# Altium footprint library 13-IC Packages-2smt2e.PcbLib: 86 footprints (part 6 of 6)
Each footprint in its own frame and in the unit in brackets; x right, y up, seen from the top. Pads: shape width x height; smd on the part's side, far side on the other; paste and mask are expansions set on the pad; w line width, h text height; cw(c..) or ccw(c..) is an arc to the next point about the centre after c.
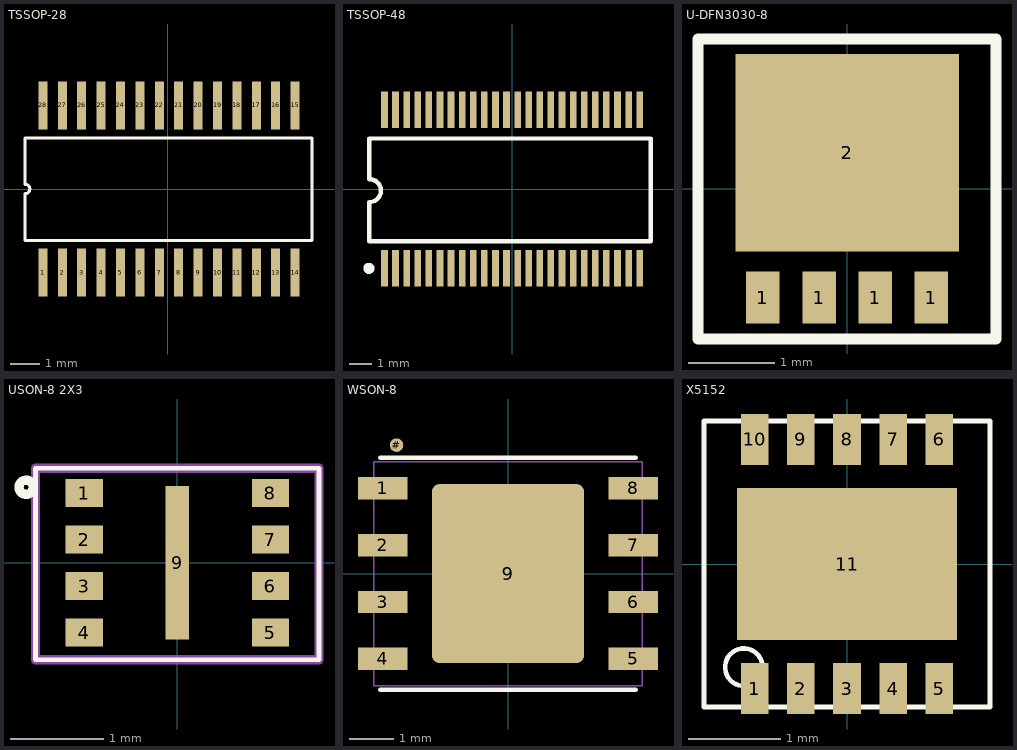
[diagram p5: the footprints below, top view; thin cyan lines are the x and y axes]

## TSSOP-28 [mm]
pads (28):
  rect 0.3x1.6 smd mask+0.07: 1(-4.191,-2.8) 2(-3.541,-2.8) 3(-2.891,-2.8) 4(-2.241,-2.8) 5(-1.591,-2.8) 6(-0.941,-2.8) 7(-0.291,-2.8) 8(0.359,-2.8) 9(1.009,-2.8) 10(1.659,-2.8) 11(2.309,-2.8) 12(2.959,-2.8) 13(3.609,-2.8) 14(4.259,-2.8) 15(4.259,2.8) 16(3.609,2.8) 17(2.959,2.8) 18(2.309,2.8) 19(1.659,2.8) 20(1.009,2.8) 21(0.359,2.8) 22(-0.291,2.8) 23(-0.941,2.8) 24(-1.591,2.8) 25(-2.241,2.8) 26(-2.891,2.8) 27(-3.541,2.8) 28(-4.191,2.8)
Top Overlay:
  lines w0.102: -4.788,1.702 -4.788,0.159 cw(c-4.788,0) -4.788,-0.159 -4.788,-1.727 4.826,-1.727 4.826,1.702 -4.775,1.702
3D body "tssop-28.stp": height 1.2, standoff 0.05, extent -4.874,-3.3 4.926,3.3

## TSSOP-48 [mm] "LTC1760"
pads (48):
  rect 0.3x1.65 smd: 1(-5.75,-3.575) 2(-5.25,-3.575) 3(-4.75,-3.575) 4(-4.25,-3.575) 5(-3.75,-3.575) 6(-3.25,-3.575) 7(-2.75,-3.575) 8(-2.25,-3.575) 9(-1.75,-3.575) 10(-1.25,-3.575) 11(-0.75,-3.575) 12(-0.25,-3.575) 13(0.25,-3.575) 14(0.75,-3.575) 15(1.25,-3.575) 16(1.75,-3.575) 17(2.25,-3.575) 18(2.75,-3.575) 19(3.25,-3.575) 20(3.75,-3.575) 21(4.25,-3.575) 22(4.75,-3.575) 23(5.25,-3.575) 24(5.75,-3.575) 25(5.75,3.575) 26(5.25,3.575) 27(4.75,3.575) 28(4.25,3.575) 29(3.75,3.575) 30(3.25,3.575) 31(2.75,3.575) 32(2.25,3.575) 33(1.75,3.575) 34(1.25,3.575) 35(0.75,3.575) 36(0.25,3.575) 37(-0.25,3.575) 38(-0.75,3.575) 39(-1.25,3.575) 40(-1.75,3.575) 41(-2.25,3.575) 42(-2.75,3.575) 43(-3.25,3.575) 44(-3.75,3.575) 45(-4.25,3.575) 46(-4.75,3.575) 47(-5.25,3.575) 48(-5.75,3.575)
Top Overlay:
  circle w0.25: c-6.45,-3.575 r0.125
  lines w0.2: -6.425,-2.35 -6.425,-0.592 ccw(c-6.425,-0.075) -6.425,0.442 -6.425,2.275 6.25,2.275 6.25,-2.35 -6.425,-2.35
3D body "1_65-0_3.stp": height 0.01, standoff 0, extent 5.6,-4.4 5.9,-2.75
3D body "1_65-0_3.stp": height 0.01, standoff 0, extent 5.1,-4.4 5.4,-2.75
3D body "1_65-0_3.stp": height 0.01, standoff 0, extent 4.6,-4.4 4.9,-2.75
3D body "1_65-0_3.stp": height 0.01, standoff 0, extent 4.1,-4.4 4.4,-2.75
3D body "1_65-0_3.stp": height 0.01, standoff 0, extent 3.6,-4.4 3.9,-2.75
3D body "1_65-0_3.stp": height 0.01, standoff 0, extent 3.1,-4.4 3.4,-2.75
3D body "1_65-0_3.stp": height 0.01, standoff 0, extent 2.6,-4.4 2.9,-2.75
3D body "1_65-0_3.stp": height 0.01, standoff 0, extent 2.1,-4.4 2.4,-2.75
3D body "1_65-0_3.stp": height 0.01, standoff 0, extent 1.6,-4.4 1.9,-2.75
3D body "1_65-0_3.stp": height 0.01, standoff 0, extent 1.1,-4.4 1.4,-2.75
3D body "1_65-0_3.stp": height 0.01, standoff 0, extent 0.6,-4.4 0.9,-2.75
3D body "1_65-0_3.stp": height 0.01, standoff 0, extent 0.1,-4.4 0.4,-2.75
3D body "1_65-0_3.stp": height 0.01, standoff 0, extent -0.4,-4.4 -0.1,-2.75
3D body "1_65-0_3.stp": height 0.01, standoff 0, extent -0.9,-4.4 -0.6,-2.75
3D body "1_65-0_3.stp": height 0.01, standoff 0, extent -1.4,-4.4 -1.1,-2.75
3D body "1_65-0_3.stp": height 0.01, standoff 0, extent -1.9,-4.4 -1.6,-2.75
3D body "1_65-0_3.stp": height 0.01, standoff 0, extent -2.4,-4.4 -2.1,-2.75
3D body "1_65-0_3.stp": height 0.01, standoff 0, extent -2.9,-4.4 -2.6,-2.75
3D body "1_65-0_3.stp": height 0.01, standoff 0, extent -3.4,-4.4 -3.1,-2.75
3D body "1_65-0_3.stp": height 0.01, standoff 0, extent -3.9,-4.4 -3.6,-2.75
3D body "1_65-0_3.stp": height 0.01, standoff 0, extent -4.4,-4.4 -4.1,-2.75
3D body "1_65-0_3.stp": height 0.01, standoff 0, extent -4.9,-4.4 -4.6,-2.75
3D body "1_65-0_3.stp": height 0.01, standoff 0, extent -5.4,-4.4 -5.1,-2.75
3D body "1_65-0_3.stp": height 0.01, standoff 0, extent -5.9,-4.4 -5.6,-2.75
3D body "1_65-0_3.stp": height 0.01, standoff 0, extent 5.6,2.75 5.9,4.4
3D body "1_65-0_3.stp": height 0.01, standoff 0, extent 5.1,2.75 5.4,4.4
3D body "1_65-0_3.stp": height 0.01, standoff 0, extent 4.6,2.75 4.9,4.4
3D body "1_65-0_3.stp": height 0.01, standoff 0, extent 4.1,2.75 4.4,4.4
3D body "1_65-0_3.stp": height 0.01, standoff 0, extent 3.6,2.75 3.9,4.4
3D body "1_65-0_3.stp": height 0.01, standoff 0, extent 3.1,2.75 3.4,4.4
3D body "1_65-0_3.stp": height 0.01, standoff 0, extent 2.6,2.75 2.9,4.4
3D body "1_65-0_3.stp": height 0.01, standoff 0, extent 2.1,2.75 2.4,4.4
3D body "1_65-0_3.stp": height 0.01, standoff 0, extent 1.6,2.75 1.9,4.4
3D body "1_65-0_3.stp": height 0.01, standoff 0, extent 1.1,2.75 1.4,4.4
3D body "1_65-0_3.stp": height 0.01, standoff 0, extent 0.6,2.75 0.9,4.4
3D body "1_65-0_3.stp": height 0.01, standoff 0, extent 0.1,2.75 0.4,4.4
3D body "1_65-0_3.stp": height 0.01, standoff 0, extent -0.4,2.75 -0.1,4.4
3D body "1_65-0_3.stp": height 0.01, standoff 0, extent -0.9,2.75 -0.6,4.4
3D body "1_65-0_3.stp": height 0.01, standoff 0, extent -1.4,2.75 -1.1,4.4
3D body "1_65-0_3.stp": height 0.01, standoff 0, extent -1.9,2.75 -1.6,4.4
3D body "1_65-0_3.stp": height 0.01, standoff 0, extent -2.4,2.75 -2.1,4.4
3D body "1_65-0_3.stp": height 0.01, standoff 0, extent -2.9,2.75 -2.6,4.4
3D body "1_65-0_3.stp": height 0.01, standoff 0, extent -3.4,2.75 -3.1,4.4
3D body "1_65-0_3.stp": height 0.01, standoff 0, extent -3.9,2.75 -3.6,4.4
3D body "1_65-0_3.stp": height 0.01, standoff 0, extent -4.4,2.75 -4.1,4.4
3D body "1_65-0_3.stp": height 0.01, standoff 0, extent -4.9,2.75 -4.6,4.4
3D body "1_65-0_3.stp": height 0.01, standoff 0, extent -5.4,2.75 -5.1,4.4
3D body "1_65-0_3.stp": height 0.01, standoff 0, extent -5.9,2.75 -5.6,4.4
3D body "tssop-48.stp": height 1.1, standoff 0.02, extent -6.25,-4.1 6.25,4.1

## U-DFN3030-8 [mm]
pads (5):
  rect 0.39x0.6 smd mask+0.07: 1(-0.976,-1.259) 1(-0.324,-1.259) 1(0.326,-1.259) 1(0.976,-1.259)
  rect 2.59x2.29 smd: 2(0.001,0.421)
Top Overlay:
  lines w0.127: -1.727,-1.74 -1.727,1.74 1.727,1.74 1.727,-1.74 -1.727,-1.74
3D body "xm5152.stp": height 0.75, standoff 0, extent -1.5,-1.51 1.5,1.51

## USON-8 2X3 [mm]
pads (9):
  rect 0.4x0.3 smd mask+0.051: 1(-1.001,0.75) 2(-1.001,0.25) 3(-1.001,-0.25) 4(-1.001,-0.75) 5(1.001,-0.75) 6(1.001,-0.25) 7(1.001,0.25) 8(1.001,0.75)
  rect 0.25x1.65 smd mask+0.051: 9(0,0)
Top Overlay:
  circle w0.1: c-1.626,0.813 r0.076
  lines w0.05: -1.524,-1.041 -1.524,1.016 1.524,1.016 1.524,-1.041 -1.524,-1.041
Mechanical 14:
  lines w0.1: -1.524,-1.041 1.524,-1.041 1.524,1.016 -1.524,1.016 -1.524,-1.041
Mechanical 15:
  lines w0.1: -1.524,-1.041 1.524,-1.041 1.524,1.016 -1.524,1.016 -1.524,-1.041
3D body "uson-8-2x3.stp": height 0.6, standoff 0, extent -1.5,-1 1.5,1

## WSON-8 [mm] "SPI Flash"
height 0.8
pads (10):
  rect 1.1x0.5 smd mask+0.07: 1(-2.8,1.905) 2(-2.8,0.635) 3(-2.8,-0.635) 4(-2.8,-1.905) 5(2.8,-1.905) 7(2.8,0.635) 8(2.8,1.905)
  rect 1.1x0.5 smd: 6(2.8,-0.635)
  rrect10% 3.4x4 smd mask+0.07: 9(0,0)
  round 0.3 smd mask+0.07: #(-2.489,2.87)
Top Overlay:
  lines w0.1: -2.85,-2.591 2.85,-2.591 ; -2.85,2.591 2.85,2.591
Mechanical 15:
  lines w0.03: -3,-2.5 3,-2.5 3,2.5 -3,2.5 -3,-2.5
3D body "0_4572-1_016.stp": height 0.02, standoff 0, extent 2.184,1.677 3.2,2.134
3D body "0_4572-1_016.stp": height 0.02, standoff 0, extent 2.184,0.406 3.2,0.864
3D body "0_4572-1_016.stp": height 0.02, standoff 0, extent 2.184,-0.863 3.2,-0.406
3D body "0_4572-1_016.stp": height 0.02, standoff 0, extent 2.184,-2.134 3.2,-1.676
3D body "0_4572-1_016.stp": height 0.02, standoff 0, extent -3.2,-2.134 -2.184,-1.676
3D body "0_4572-1_016.stp": height 0.02, standoff 0, extent -3.2,-0.864 -2.184,-0.406
3D body "0_4572-1_016.stp": height 0.02, standoff 0, extent -3.2,0.406 -2.184,0.864
3D body "0_4572-1_016.stp": height 0.02, standoff 0, extent -3.2,1.676 -2.184,2.134
3D body "sst25vf080.stp": height 0.81, standoff 0, extent -3.026,-2.5 3.025,2.5

## X5152 [mm]
pads (11):
  rect 0.3x0.55 smd mask+0.051: 1(-1,-1.35) 2(-0.5,-1.35) 3(0,-1.35) 4(0.5,-1.35) 5(1,-1.35) 6(1,1.35) 7(0.5,1.35) 8(0,1.35) 9(-0.5,1.35) 10(-1,1.35)
  rect 2.38x1.65 smd mask+0.051: 11(0,0)
Top Overlay:
  circle w0.051: c-1.118,-1.118 r0.203
  lines w0.051: -1.549,-1.549 1.549,-1.549 1.549,1.549 -1.549,1.549 -1.549,-1.549
3D body "xm5152.stp": height 0.75, standoff 0, extent -1.499,-1.524 1.501,1.496